# Altium footprint library NDLib.PCBLIB: 499 footprints (part 13 of 32)
Each footprint in its own frame and in the unit in brackets; x right, y up, seen from the top. Pads: shape width x height; smd on the part's side, far side on the other; paste and mask are expansions set on the pad; w line width, h text height; cw(c..) or ccw(c..) is an arc to the next point about the centre after c.
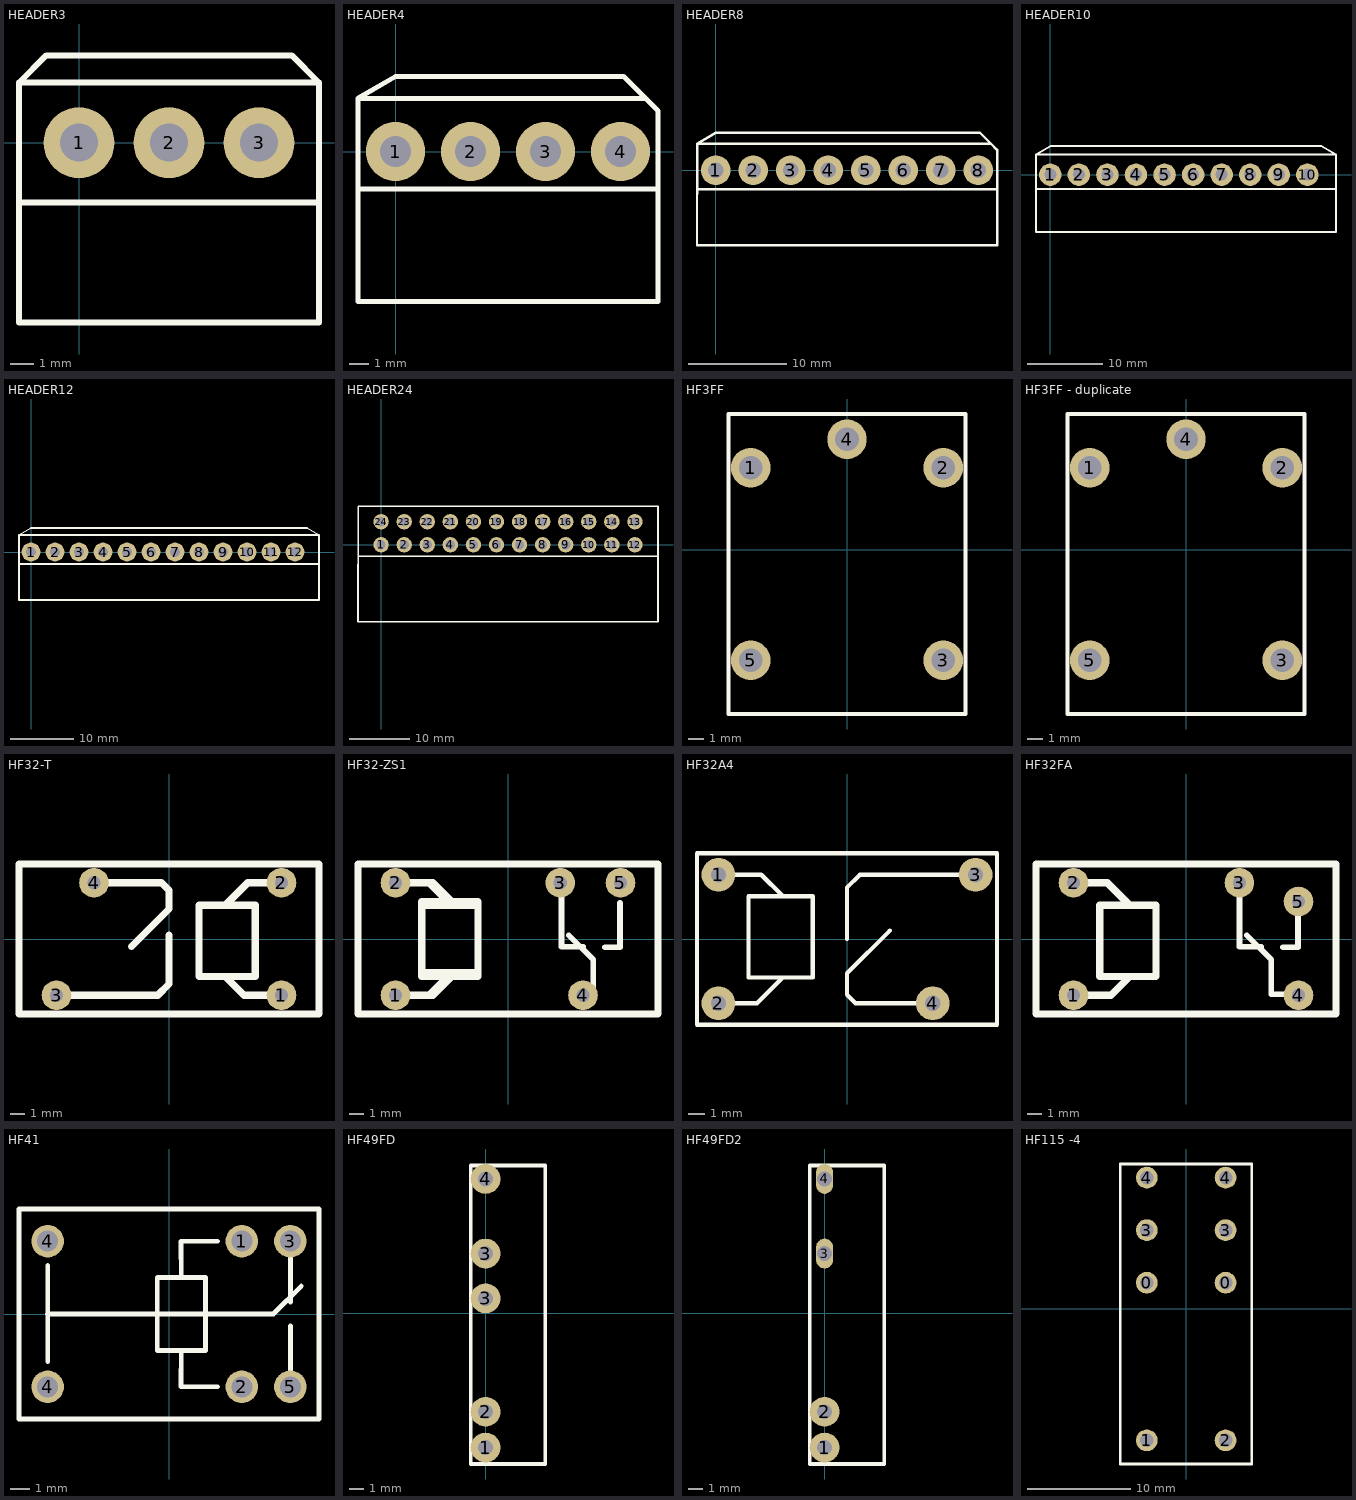
[diagram p12: the footprints below, top view; thin cyan lines are the x and y axes]

## HEADER3 [mm]
pads (3):
  round 3 hole 1.6: 1(0,0) 2(3.81,0) 3(7.62,0)
TopOverlay:
  lines w0.254: -2.54,-2.54 10.16,-2.54 ; -2.54,2.54 -1.385,3.695 9.005,3.695 10.16,2.54 ; -2.54,2.54 10.16,2.54 ; -2.54,2.54 -2.54,-7.62 -1.905,-7.62 10.16,-7.62 10.16,2.54

## HEADER4 [mm]
pads (4):
  round 3 hole 1.6: 1(0,0) 2(3.81,0) 3(7.62,0) 4(11.43,0)
TopOverlay:
  lines w0.254: -1.905,-1.905 13.335,-1.905 ; -1.9,2.7 12.7,2.7 ; -1.9,2.7 0,3.81 11.59,3.81 12.7,2.7 ; -1.9,2.7 -1.905,-7.62 13.335,-7.62 13.335,2.065 12.7,2.7

## HEADER8 [mm]
pads (8):
  round 3 hole 1.6: 1(0,0) 2(3.81,0) 3(7.62,0) 4(11.43,0) 5(15.24,0) 6(19.05,0) 7(22.86,0) 8(26.67,0)
TopOverlay:
  lines w0.254: -1.905,-1.905 28.575,-1.905 ; 5.72,2.7 -1.9,2.7 ; -1.9,2.7 27.94,2.7 ; -1.9,2.7 0,3.81 26.83,3.81 27.94,2.7 ; -1.9,2.7 -1.905,-7.62 28.575,-7.62 28.575,2.065 27.94,2.7

## HEADER10 [mm]
pads (10):
  round 3 hole 1.6: 1(0,0) 2(3.81,0) 3(7.62,0) 4(11.43,0) 5(15.24,0) 6(19.05,0) 7(22.86,0) 8(26.67,0) 9(30.48,0) 10(34.29,0)
TopOverlay:
  lines w0.254: -1.905,-1.905 38.1,-1.905 ; 5.72,2.7 -1.9,2.7 ; 38.1,-7.62 -1.905,-7.62 -1.9,2.7 ; 38.11,-7.62 38.11,2.7 ; -1.9,2.7 38.11,2.7 ; -1.9,2.7 0,3.81 36.21,3.81 38.11,2.7

## HEADER12 [mm]
pads (12):
  round 3 hole 1.6: 1(0,0) 2(3.81,0) 3(7.62,0) 4(11.43,0) 5(15.24,0) 6(19.05,0) 7(22.86,0) 8(26.67,0) 9(30.48,0) 10(34.29,0) 11(38.1,0) 12(41.91,0)
TopOverlay:
  lines w0.254: -1.905,-1.905 45.72,-1.905 ; -1.9,2.7 -1.905,-7.62 45.72,-7.62 45.72,2.7 ; -1.9,2.7 5.72,2.7 45.72,2.7 ; -1.9,2.7 0,3.81 43.82,3.81 45.72,2.7

## HEADER24 [mil]
pads (24):
  round 100 hole 60: 1(0,0) 2(150,0) 3(300,0) 4(450,0) 5(600,0) 6(750,0) 7(900,0) 8(1050,0) 9(1200,0) 10(1350,0) 11(1500,0) 12(1650,0) 13(1650,150) 14(1500,150) 15(1350,150) 16(1200,150) 17(1050,150) 18(900,150) 19(750,150) 20(600,150) 21(450,150) 22(300,150) 23(150,150) 24(0,150)
TopOverlay:
  lines w10: -150.04,-75 1800,-75 ; -150.27,-500 1800,-500 1800,250 -149.9,250 -150.27,-500

## HF3FF [mm] "HF3FF"
height 12
pads (5):
  round 2.5 hole 1.5: 1(-6.1,5.2) 2(6.1,5.2) 3(6.1,-7) 4(0,7) 5(-6.1,-7)
TopOverlay:
  lines w0.254: -7.5,-10.4 -7.5,8.6 7.5,8.6 7.5,-10.4 -7.5,-10.4

## HF3FF - duplicate [mm] "HF3FF"
height 12
pads (5):
  round 2.5 hole 1.5: 1(-6.1,5.2) 2(6.1,5.2) 3(6.1,-7) 4(0,7) 5(-6.1,-7)
TopOverlay:
  lines w0.254: -7.5,-10.4 7.5,-10.4 7.5,8.6 -7.5,8.6 -7.5,-10.4

## HF32-T [mm]
pads (4):
  round 2 hole 0.9: 1(7.62,-3.81) 2(7.62,3.81) 3(-7.62,-3.81) 4(-5.08,3.81)
TopOverlay:
  lines w0.5: -7.62,-3.81 -2.54,-3.81 -0.762,-3.81 0,-3.048 0,0.254 ; -5.08,3.81 -1.27,3.81 -0.508,3.81 0,3.302 0,2.032 -2.54,-0.508 ; 2.032,0.762 2.032,2.286 5.842,2.286 5.842,-2.54 2.032,-2.54 2.032,2.032 ; 3.81,-2.54 5.08,-3.81 7.62,-3.81 ; 3.81,2.286 5.334,3.81 7.62,3.81 ; -10.16,-5.08 10.16,-5.08 10.16,5.08 -10.16,5.08 -10.16,-5.08

## HF32-ZS1 [mm]
pads (5):
  round 2 hole 0.9: 1(-7.62,-3.81) 2(-7.62,3.81) 3(3.54,3.81) 4(5.08,-3.81) 5(7.62,3.81)
TopOverlay:
  lines w0.381: 3.62,3.048 3.62,-0.528 5.093,-0.528 ; 4.127,0.25 5.786,-1.408 5.786,-3.754 ; 6.573,-0.566 7.584,-0.566 7.584,2.439
  lines w0.5: -3.81,-2.54 -5.08,-3.81 -7.62,-3.81 -5.334,-3.81 -3.81,-2.286 ; -3.81,2.286 -5.334,3.81 -7.62,3.81 -5.08,3.81 -3.81,2.54 ; -2.032,-2.032 -2.032,2.54 -5.842,2.54 -5.842,-2.286 -2.032,-2.286 -2.032,-0.762 ; -2.032,0.762 -2.032,2.286 -5.842,2.286 -5.842,-2.54 -2.032,-2.54 -2.032,2.032 ; -10.16,-5.08 10.16,-5.08 ; -10.16,-5.08 -10.16,5.08 ; -10.16,-5.08 10.16,-5.08 ; -10.16,-5.08 -10.16,5.08 ; -10.16,5.08 10.16,5.08 ; -10.16,5.08 10.16,5.08 ; 10.16,-5.08 10.16,5.08 ; 10.16,-5.08 10.16,5.08

## HF32A4 [mm]
height 10
pads (4):
  round 2 hole 0.9: 1(-7.62,3.81) 2(-7.62,-3.81) 3(7.62,3.81) 4(5.08,-3.81)
TopOverlay:
  lines w0.254: -7.62,-3.81 -5.334,-3.81 -3.81,-2.286 ; -7.62,3.81 -5.08,3.81 -3.81,2.54 ; -2.032,-2.032 -2.032,2.54 -5.842,2.54 -5.842,-2.286 -2.032,-2.286 -2.032,-0.762 ; 0,0 0,3.048 0.762,3.81 2.54,3.81 7.62,3.81 ; 2.54,0.508 0,-2.032 0,-3.302 0.508,-3.81 1.27,-3.81 5.08,-3.81 ; -8.89,-5.08 -8.89,5.08 8.89,5.08 8.89,-5.08 -8.89,-5.08

## HF32FA [mm]
pads (5):
  round 2 hole 0.9: 1(-7.62,-3.81) 2(-7.62,3.81) 3(3.62,3.81) 4(7.62,-3.81) 5(7.62,2.54)
TopOverlay:
  lines w0.381: 3.62,3.048 3.62,-0.528 5.093,-0.528 ; 4.127,0.25 5.786,-1.408 5.786,-3.754 7.911,-3.754 ; 6.573,-0.566 7.584,-0.566 7.584,2.439
  lines w0.5: -7.62,-3.81 -5.08,-3.81 -3.81,-2.54 ; -7.62,3.81 -5.334,3.81 -3.81,2.286 ; -2.032,0.762 -2.032,2.286 -5.842,2.286 -5.842,-2.54 -2.032,-2.54 -2.032,2.032 ; -10.16,-5.08 10.16,-5.08 10.16,5.08 -10.16,5.08 -10.16,-5.08

## HF41 [mm]
pads (6):
  round 1.7 hole 1.1: 1(3.81,3.81) 2(3.81,-3.81) 3(6.35,3.81) 4(-6.35,-3.81) 4(-6.35,3.81) 5(6.35,-3.81)
TopOverlay:
  lines w0.252: -6.35,-2.503 -6.35,2.54 ; -0.616,-1.905 -0.616,1.905 ; 1.905,-1.905 1.905,1.905
  lines w0.254: -6.35,0 4.445,0 5.461,0 6.921,1.46 ; -0.616,-1.905 1.905,-1.905 ; -0.616,1.905 1.905,1.905 ; 0.644,-1.905 0.635,-3.81 2.54,-3.81 ; 0.644,1.905 0.635,3.81 2.54,3.81 ; 6.35,-3.175 6.35,-0.635 ; 6.35,0.635 6.35,3.175 ; -7.85,-5.5 7.85,-5.5 7.85,5.5 -7.85,5.5 -7.85,-5.5

## HF49FD [mm]
height 15
pads (5):
  round 2 hole 1: 1(0,-9) 2(0,-6.6) 3(0,4) 3(0,1) 4(0,9)
TopOverlay:
  lines w0.254: -1,-10.1 -1,9.9 4,9.9 4,-10.1 -1,-10.1

## HF49FD2 [mm]
height 15
pads (4):
  round 2 hole 1: 1(0,-9) 2(0,-6.6)
  oval 1.143x2 hole 1: 3(0,4) 4(0,9)
TopOverlay:
  lines w0.254: -1,-10.1 4,-10.1 4,9.9 -1,9.9 -1,-10.1

## HF115 -4 [mm]
height 20
pads (8):
  round 2.1 hole 1.3: 0(-3.81,2.54) 0(3.81,2.54) 1(-3.81,-12.7) 2(3.81,-12.7) 3(-3.81,7.62) 3(3.81,7.62) 4(-3.81,12.7) 4(3.81,12.7)
TopOverlay:
  lines w0.254: -6.367,-14.986 6.333,-14.986 6.333,14.014 -6.367,14.014 -6.367,-14.986